# Altium footprint library ICs And Semiconductors SMD.PcbLib: 943 footprints (part 10 of 60)
Each footprint in its own frame and in the unit in brackets; x right, y up, seen from the top. Pads: shape width x height; smd on the part's side, far side on the other; paste and mask are expansions set on the pad; w line width, h text height; cw(c..) or ccw(c..) is an arc to the next point about the centre after c.
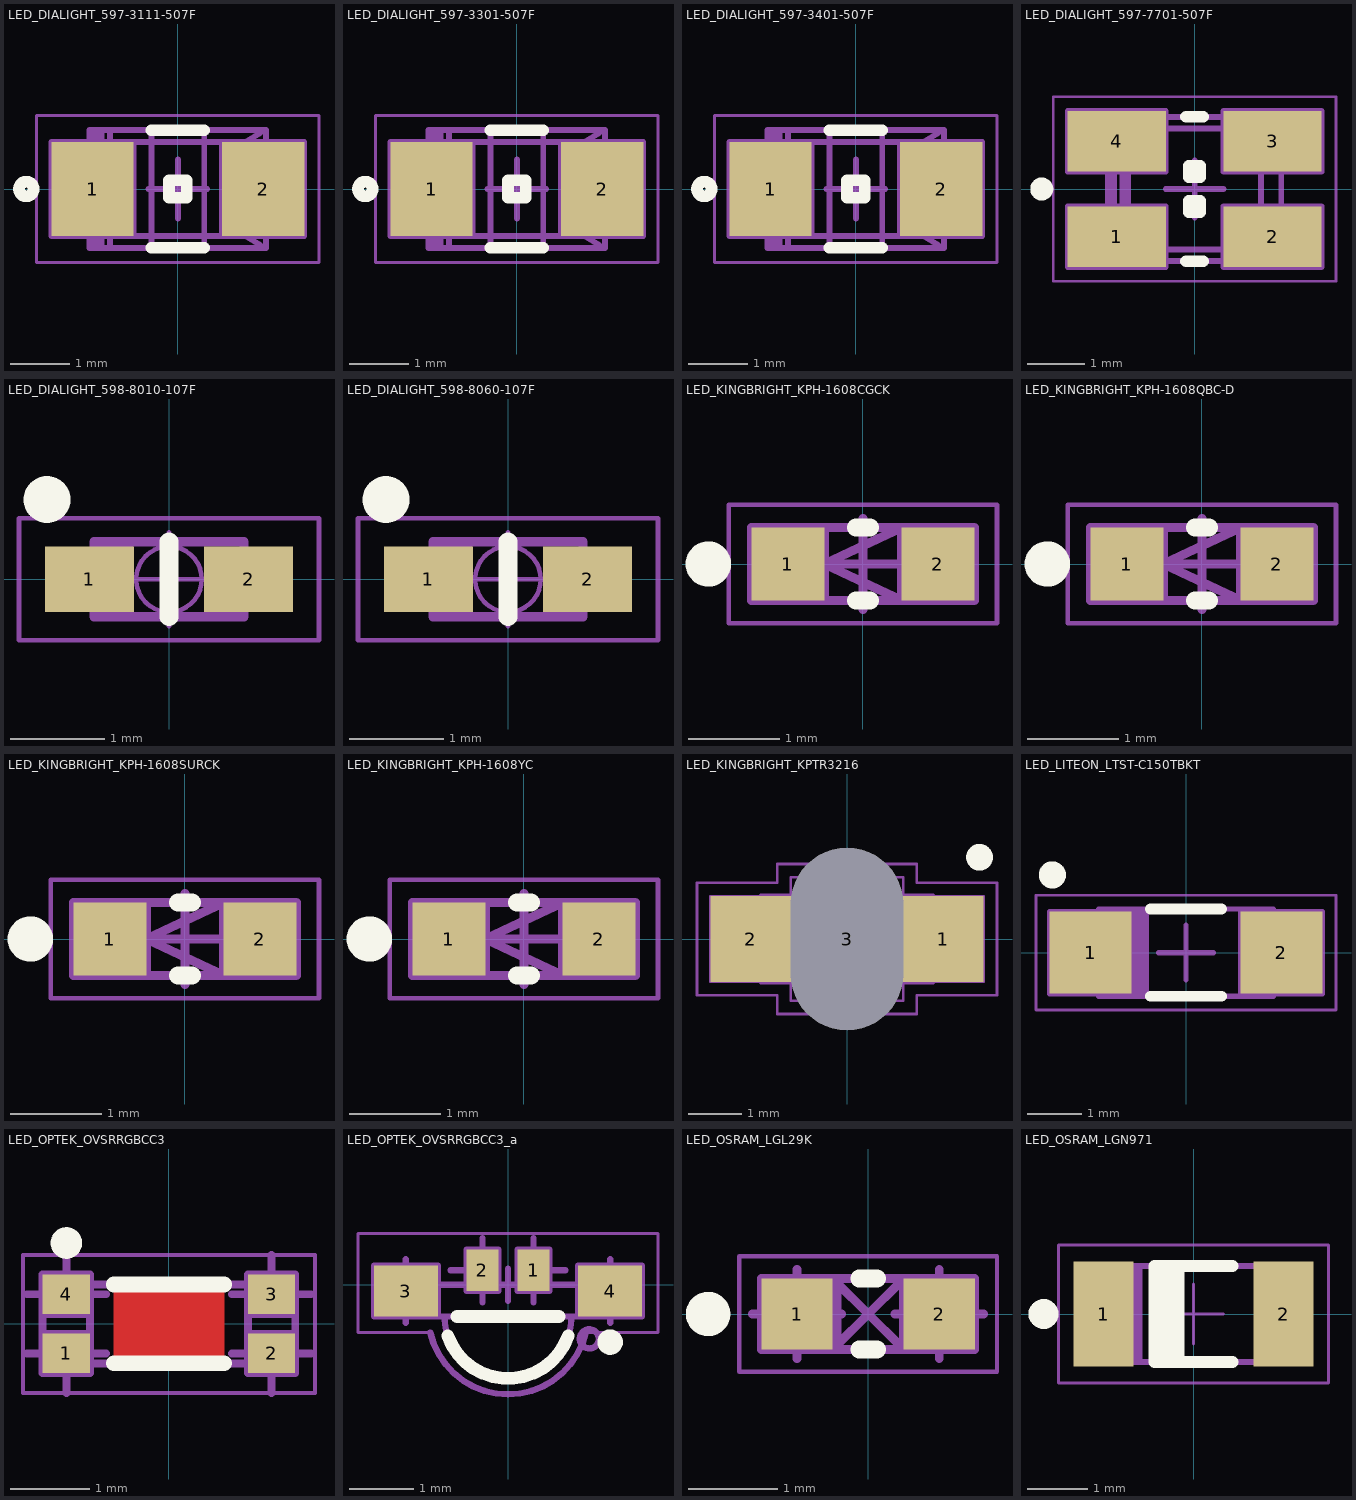
[diagram p9: the footprints below, top view; thin cyan lines are the x and y axes]

## LED_DIALIGHT_597-3111-507F [mm] "SMT AlGaAs Red LED, Body 3x1.6mm (1208),  DIALIGHT 597 Serie"
height 1.5
pads (2):
  rect 1.4x1.6 smd: 1(-1.45,0) 2(1.45,0)
Top Overlay:
  circle w0.2: c-2.575,0 r0.125
  lines w0.2: -0.45,-1 0.45,-1 ; -0.45,1 0.45,1 ; -0.15,-0.15 0.15,-0.15 0.15,0.15 -0.15,0.15 -0.15,-0.15
Mechanical 8:
  lines w0.1: -1.95,0 -1.45,0 ; -1.45,-0.5 -1.45,0 ; -1.45,0.5 -1.45,0 ; -0.95,0 -1.45,0 ; -0.5,0 0,0 ; -0.45,-1 -0.45,1 ; 0,-0.5 0,0 ; 0,0.5 0,0 ; 0.45,-1 0.45,1 ; 0.5,0 0,0 ; 0.95,0 1.45,0 ; 1.45,-0.5 1.45,0 ; 1.45,0.5 1.45,0 ; 1.95,0 1.45,0 ; -2.15,-0.8 -0.75,-0.8 -0.75,0.8 -2.15,0.8 -2.15,-0.8 ; 0.75,-0.8 2.15,-0.8 2.15,0.8 0.75,0.8 0.75,-0.8
Mechanical 14:
  lines w0.1: -1.4,-1 -1.4,1 ; -1.3,-1 -1.3,1 ; -1.15,-0.95 -1.15,0.95 ; -1.15,-0.8 1.15,-0.8 ; -1.15,0.8 1.15,0.8 ; 1.4,-0.95 1.15,-0.8 ; 1.4,0.95 1.15,0.8 ; 1.15,-0.8 1.15,0.8 ; -1.5,-1 1.5,-1 1.5,1 -1.5,1 -1.5,-1 ; -0.15,-0.15 0.15,-0.15 0.15,0.15 -0.15,0.15 -0.15,-0.15
Mechanical 15:
  lines w0.05: -2.4,-1.25 2.4,-1.25 2.4,1.25 -2.4,1.25 -2.4,-1.25
3D body "LED_DIALIGHT_597-3111-507F.stp": height 1.5, standoff 0, extent -1.5,-1 1.5,1

## LED_DIALIGHT_597-3301-507F [mm] "SMT Green LED, Body 3x1.6mm (1208),  DIALIGHT 597 Serie"
height 1.5
pads (2):
  rect 1.4x1.6 smd: 1(-1.45,0) 2(1.45,0)
Top Overlay:
  circle w0.2: c-2.575,0 r0.125
  lines w0.2: -0.45,-1 0.45,-1 ; -0.45,1 0.45,1 ; -0.15,-0.15 -0.15,0.15 0.15,0.15 0.15,-0.15 -0.15,-0.15
Mechanical 8:
  lines w0.1: -1.95,0 -1.45,0 ; -1.45,-0.5 -1.45,0 ; -1.45,0.5 -1.45,0 ; -0.95,0 -1.45,0 ; -0.5,0 0,0 ; -0.45,-1 -0.45,1 ; 0,-0.5 0,0 ; 0,0.5 0,0 ; 0.45,-1 0.45,1 ; 0.5,0 0,0 ; 0.95,0 1.45,0 ; 1.45,-0.5 1.45,0 ; 1.45,0.5 1.45,0 ; 1.95,0 1.45,0 ; -2.15,-0.8 -2.15,0.8 -0.75,0.8 -0.75,-0.8 -2.15,-0.8 ; 0.75,-0.8 0.75,0.8 2.15,0.8 2.15,-0.8 0.75,-0.8
Mechanical 14:
  lines w0.1: -1.4,-1 -1.4,1 ; -1.3,-1 -1.3,1 ; -1.15,-0.95 -1.15,0.95 ; -1.15,-0.8 1.15,-0.8 ; -1.15,0.8 1.15,0.8 ; 1.4,-0.95 1.15,-0.8 ; 1.4,0.95 1.15,0.8 ; 1.15,-0.8 1.15,0.8 ; -1.5,-1 -1.5,1 1.5,1 1.5,-1 -1.5,-1 ; -0.15,-0.15 -0.15,0.15 0.15,0.15 0.15,-0.15 -0.15,-0.15
Mechanical 15:
  lines w0.05: -2.4,-1.25 -2.4,1.25 2.4,1.25 2.4,-1.25 -2.4,-1.25
3D body "LED_DIALIGHT_597-3301-507F.stp": height 1.5, standoff 0, extent -1.5,-1 1.5,1

## LED_DIALIGHT_597-3401-507F [mm] "SMT Yellow LED, Body 3x1.6mm (1208),  DIALIGHT 597 Serie"
height 1.5
pads (2):
  rect 1.4x1.6 smd: 1(-1.45,0) 2(1.45,0)
Top Overlay:
  circle w0.2: c-2.575,0 r0.125
  lines w0.2: -0.45,-1 0.45,-1 ; -0.45,1 0.45,1 ; -0.15,-0.15 -0.15,0.15 0.15,0.15 0.15,-0.15 -0.15,-0.15
Mechanical 8:
  lines w0.1: -1.95,0 -1.45,0 ; -1.45,-0.5 -1.45,0 ; -1.45,0.5 -1.45,0 ; -0.95,0 -1.45,0 ; -0.5,0 0,0 ; -0.45,-1 -0.45,1 ; 0,-0.5 0,0 ; 0,0.5 0,0 ; 0.45,-1 0.45,1 ; 0.5,0 0,0 ; 0.95,0 1.45,0 ; 1.45,-0.5 1.45,0 ; 1.45,0.5 1.45,0 ; 1.95,0 1.45,0 ; -2.15,-0.8 -2.15,0.8 -0.75,0.8 -0.75,-0.8 -2.15,-0.8 ; 0.75,-0.8 0.75,0.8 2.15,0.8 2.15,-0.8 0.75,-0.8
Mechanical 14:
  lines w0.1: -1.4,-1 -1.4,1 ; -1.3,-1 -1.3,1 ; -1.15,-0.95 -1.15,0.95 ; -1.15,-0.8 1.15,-0.8 ; -1.15,0.8 1.15,0.8 ; 1.4,-0.95 1.15,-0.8 ; 1.4,0.95 1.15,0.8 ; 1.15,-0.8 1.15,0.8 ; -1.5,-1 -1.5,1 1.5,1 1.5,-1 -1.5,-1 ; -0.15,-0.15 -0.15,0.15 0.15,0.15 0.15,-0.15 -0.15,-0.15
Mechanical 15:
  lines w0.05: -2.4,-1.25 -2.4,1.25 2.4,1.25 2.4,-1.25 -2.4,-1.25
3D body "LED_DIALIGHT_597-3401-507F.stp": height 1.5, standoff 0, extent -1.5,-1 1.5,1

## LED_DIALIGHT_597-7701-507F [mm] "Bicolor Red/Green SMD LED, Body L 3mm x  W 2.5mm, DIALIGHT 597 Series"
height 1.3
pads (4):
  rect 1.7x1.05 smd: 1(-1.35,-0.825) 2(1.35,-0.825) 3(1.35,0.825) 4(-1.35,0.825)
Top Overlay:
  circle w0.2: c-2.65,0 r0.1
  lines w0.2: -0.15,-1.25 0.15,-1.25 ; -0.15,1.25 0.15,1.25 ; -0.1,-0.4 -0.1,-0.2 0.1,-0.2 0.1,-0.4 -0.1,-0.4 ; -0.1,0.2 0.1,0.2 0.1,0.4 -0.1,0.4 -0.1,0.2
Mechanical 8:
  lines w0.1: -1.85,-0.825 -1.35,-0.825 ; -1.85,0.825 -1.35,0.825 ; -1.35,-1.325 -1.35,-0.825 ; -1.35,-0.325 -1.35,-0.825 ; -1.35,0.325 -1.35,0.825 ; -1.35,1.325 -1.35,0.825 ; -0.85,-0.825 -1.35,-0.825 ; -0.85,0.825 -1.35,0.825 ; -0.5,0 0,0 ; 0,-0.5 0,0 ; 0,0.5 0,0 ; 0.5,0 0,0 ; 0.85,-0.825 1.35,-0.825 ; 0.85,0.825 1.35,0.825 ; 1.35,-1.325 1.35,-0.825 ; 1.35,-0.325 1.35,-0.825 ; 1.35,0.325 1.35,0.825 ; 1.35,1.325 1.35,0.825 ; 1.85,-0.825 1.35,-0.825 ; 1.85,0.825 1.35,0.825 ; -2.2,-1.35 -2.2,-0.3 -0.5,-0.3 -0.5,-1.35 -2.2,-1.35 ; -2.2,0.3 -2.2,1.35 -0.5,1.35 -0.5,0.3 -2.2,0.3 ; 0.5,-1.35 0.5,-0.3 2.2,-0.3 2.2,-1.35 0.5,-1.35 ; 0.5,0.3 0.5,1.35 2.2,1.35 2.2,0.3 0.5,0.3
Mechanical 14:
  lines w0.1: -1.4,-1.25 -1.4,1.25 ; -1.25,-1.25 -1.25,1.25 ; -1.5,-1.25 -1.5,1.25 1.5,1.25 1.5,-1.25 -1.5,-1.25 ; -1.15,-1.05 -1.15,1.05 1.15,1.05 1.15,-1.05 -1.15,-1.05 ; -0.1,-0.4 -0.1,-0.2 0.1,-0.2 0.1,-0.4 -0.1,-0.4 ; -0.1,0.2 0.1,0.2 0.1,0.4 -0.1,0.4 -0.1,0.2
Mechanical 15:
  lines w0.05: -2.45,-1.6 -2.45,1.6 2.45,1.6 2.45,-1.6 -2.45,-1.6
3D body "LED_DIALIGHT_597-7701-507F.stp": height 1.3, standoff 0, extent -1.5,-1.25 1.5,1.25

## LED_DIALIGHT_598-8010-107F [mm] "SMT Red LED, Body 1.6x0.8mm, 0603 Case,  DIALIGHT 598 Series"
height 0.7
pads (2):
  rect 0.95x0.7 smd: 1(-0.85,0) 2(0.85,0)
Top Overlay:
  circle w0.25: c-1.3,0.85 r0.125
  lines w0.2: 0,-0.4 0,0.4
Mechanical 8:
  lines w0.001: -0.8,-0.4 0.8,-0.4 0.8,0.4 -0.8,0.4 -0.8,-0.4
Mechanical 14:
  lines w0.1: -0.8,0 -0.4,0.4 ; -0.8,0.1 -0.5,0.4 ; -0.8,0.2 -0.6,0.4 ; -0.8,0.3 -0.7,0.4 ; -0.8,-0.4 0.8,-0.4 0.8,0.4 -0.8,0.4 -0.8,-0.4
Mechanical 15:
  circle w0.05: c0,0 r0.35
  lines w0.05: -0.5,0 0.5,0 ; 0,-0.5 0,0.5 ; -1.6,-0.65 1.6,-0.65 1.6,0.65 -1.6,0.65 -1.6,-0.65
3D body "LED_DIALIGHT_598-8010-107F_Part1.stp": height 0.51, standoff -0.01, extent -0.813,-0.394 0.813,0.394
3D body "LED_DIALIGHT_598-8010-107F_Part2.stp": height 0.71, standoff 0.31, extent -0.546,-0.381 0.546,0.381

## LED_DIALIGHT_598-8060-107F [mm] "SMT Yellow-Green LED, Body 1.6x0.8mm, 0603 Case,  DIALIGHT 598 Series"
height 0.7
pads (2):
  rect 0.95x0.7 smd: 1(-0.85,0) 2(0.85,0)
Top Overlay:
  circle w0.25: c-1.3,0.85 r0.125
  lines w0.2: 0,-0.4 0,0.4
Mechanical 8:
  lines w0.001: -0.8,-0.4 -0.8,0.4 0.8,0.4 0.8,-0.4 -0.8,-0.4
Mechanical 14:
  lines w0.1: -0.8,0 -0.4,0.4 ; -0.8,0.1 -0.5,0.4 ; -0.8,0.2 -0.6,0.4 ; -0.8,0.3 -0.7,0.4 ; -0.8,-0.4 -0.8,0.4 0.8,0.4 0.8,-0.4 -0.8,-0.4
Mechanical 15:
  circle w0.05: c0,0 r0.35
  lines w0.05: -0.5,0 0.5,0 ; 0,-0.5 0,0.5 ; -1.6,-0.65 -1.6,0.65 1.6,0.65 1.6,-0.65 -1.6,-0.65
3D body "LED_DIALIGHT_598-8060-107F_Part1.stp": height 0.51, standoff -0.01, extent -0.813,-0.394 0.813,0.394
3D body "LED_DIALIGHT_598-8060-107F_Part2.stp": height 0.71, standoff 0.31, extent -0.546,-0.381 0.546,0.381

## LED_KINGBRIGHT_KPH-1608CGCK [mm] "SMT Green LED, Case 0603, Body L 1.6 x W 0.8mm H 0.65mm"
height 0.65
pads (2):
  rect 0.8x0.8 smd: 1(-0.825,0) 2(0.825,0)
Top Overlay:
  circle w0.25: c-1.7,0 r0.125
  lines w0.2: -0.075,-0.4 0.075,-0.4 ; -0.075,0.4 0.075,0.4
Mechanical 8:
  lines w0.1: -0.5,0 0,0 ; -0.425,0 0.425,0 ; 0,-0.5 0,0 ; 0,0.5 0,0 ; 0.5,0 0,0 ; -0.425,-0.4 -0.825,0 -0.425,0.4 ; -0.425,-0.4 -0.425,0.4 ; -0.425,-0.4 -1.225,-0.4 -1.225,0.4 -0.425,0.4 ; 1.225,-0.4 0.825,0 1.225,0.4 ; 1.225,-0.4 1.225,0.4 ; 1.225,-0.4 0.425,-0.4 0.425,0.4 1.225,0.4
Mechanical 14:
  lines w0.1: -0.8,-0.4 0.8,-0.4 0.8,0.4 -0.8,0.4 -0.8,-0.4 ; -0.425,0 0.425,-0.4 0.425,0.4 -0.425,0
Mechanical 15:
  lines w0.05: -1.475,-0.65 1.475,-0.65 1.475,0.65 -1.475,0.65 -1.475,-0.65
3D body "LED_KINGBRIGHT_KPH-1608CGCK_Part2.stp": height 0.65, standoff 0.12, extent -0.6,-0.4 0.6,0.4
3D body "LED_KINGBRIGHT_KPH-1608CGCK_Part1.stp": height 0.2, standoff 0, extent -0.8,-0.4 0.8,0.4

## LED_KINGBRIGHT_KPH-1608QBC-D [mm] "SMT Blue LED, Case 0603, Body L 1.6 x W 0.8mm H 0.65mm"
height 0.65
pads (2):
  rect 0.8x0.8 smd: 1(-0.825,0) 2(0.825,0)
Top Overlay:
  circle w0.25: c-1.7,0 r0.125
  lines w0.2: -0.075,-0.4 0.075,-0.4 ; -0.075,0.4 0.075,0.4
Mechanical 8:
  lines w0.1: -0.5,0 0,0 ; -0.425,0 0.425,0 ; 0,-0.5 0,0 ; 0,0.5 0,0 ; 0.5,0 0,0 ; -0.425,-0.4 -1.225,-0.4 -1.225,0.4 -0.425,0.4 ; -0.425,-0.4 -0.425,0.4 ; -0.425,-0.4 -0.825,0 -0.425,0.4 ; 1.225,-0.4 0.425,-0.4 0.425,0.4 1.225,0.4 ; 1.225,-0.4 1.225,0.4 ; 1.225,-0.4 0.825,0 1.225,0.4
Mechanical 14:
  lines w0.1: -0.8,-0.4 -0.8,0.4 0.8,0.4 0.8,-0.4 -0.8,-0.4 ; -0.425,0 0.425,0.4 0.425,-0.4 -0.425,0
Mechanical 15:
  lines w0.05: -1.475,-0.65 -1.475,0.65 1.475,0.65 1.475,-0.65 -1.475,-0.65
3D body "LED_KINGBRIGHT_KPH-1608QBC-D_Part2.stp": height 0.65, standoff 0.12, extent -0.6,-0.4 0.6,0.4
3D body "LED_KINGBRIGHT_KPH-1608QBC-D_Part1.stp": height 0.2, standoff 0, extent -0.8,-0.4 0.8,0.4

## LED_KINGBRIGHT_KPH-1608SURCK [mm] "SMT Hyper Red LED, Case 0603, Body L 1.6 x W 0.8mm H 0.65mm"
height 0.65
pads (2):
  rect 0.8x0.8 smd: 1(-0.825,0) 2(0.825,0)
Top Overlay:
  circle w0.25: c-1.7,0 r0.125
  lines w0.2: -0.075,-0.4 0.075,-0.4 ; -0.075,0.4 0.075,0.4
Mechanical 8:
  lines w0.1: -0.5,0 0,0 ; -0.425,0 0.425,0 ; 0,-0.5 0,0 ; 0,0.5 0,0 ; 0.5,0 0,0 ; -0.425,-0.4 -0.825,0 -0.425,0.4 ; -0.425,-0.4 -0.425,0.4 ; -0.425,-0.4 -1.225,-0.4 -1.225,0.4 -0.425,0.4 ; 1.225,-0.4 0.825,0 1.225,0.4 ; 1.225,-0.4 1.225,0.4 ; 1.225,-0.4 0.425,-0.4 0.425,0.4 1.225,0.4
Mechanical 14:
  lines w0.1: -0.8,-0.4 0.8,-0.4 0.8,0.4 -0.8,0.4 -0.8,-0.4 ; -0.425,0 0.425,-0.4 0.425,0.4 -0.425,0
Mechanical 15:
  lines w0.05: -1.475,-0.65 1.475,-0.65 1.475,0.65 -1.475,0.65 -1.475,-0.65
3D body "LED_KINGBRIGHT_KPH-1608SURCK_Part1.stp": height 0.2, standoff 0, extent -0.8,-0.4 0.8,0.4
3D body "LED_KINGBRIGHT_KPH-1608SURCK_Part2.stp": height 0.65, standoff 0.12, extent -0.6,-0.4 0.6,0.4

## LED_KINGBRIGHT_KPH-1608YC [mm] "SMT Hyper Yellow LED, Case 0603, Body L 1.6 x W 0.8mm H 0.65mm"
height 0.65
pads (2):
  rect 0.8x0.8 smd: 1(-0.825,0) 2(0.825,0)
Top Overlay:
  circle w0.25: c-1.7,0 r0.125
  lines w0.2: -0.075,-0.4 0.075,-0.4 ; -0.075,0.4 0.075,0.4
Mechanical 8:
  lines w0.1: -0.5,0 0,0 ; -0.425,0 0.425,0 ; 0,-0.5 0,0 ; 0,0.5 0,0 ; 0.5,0 0,0 ; -0.425,-0.4 -1.225,-0.4 -1.225,0.4 -0.425,0.4 ; -0.425,-0.4 -0.425,0.4 ; -0.425,-0.4 -0.825,0 -0.425,0.4 ; 1.225,-0.4 0.425,-0.4 0.425,0.4 1.225,0.4 ; 1.225,-0.4 1.225,0.4 ; 1.225,-0.4 0.825,0 1.225,0.4
Mechanical 14:
  lines w0.1: -0.8,-0.4 -0.8,0.4 0.8,0.4 0.8,-0.4 -0.8,-0.4 ; -0.425,0 0.425,0.4 0.425,-0.4 -0.425,0
Mechanical 15:
  lines w0.05: -1.475,-0.65 -1.475,0.65 1.475,0.65 1.475,-0.65 -1.475,-0.65
3D body "LED_KINGBRIGHT_KPH-1608YC_Part2.stp": height 0.65, standoff 0.12, extent -0.6,-0.4 0.6,0.4
3D body "LED_KINGBRIGHT_KPH-1608YC_Part1.stp": height 0.2, standoff 0, extent -0.8,-0.4 0.8,0.4

## LED_KINGBRIGHT_KPTR3216 [mm] "Reverse Mount LED 3216, Hole 2.1x2.3mm 0.35mm Height"
height 0.35
pads (3):
  rect 1.5x1.6 smd: 1(1.8,0) 2(-1.8,0)
  oval 1.9x3.2 hole 2.1 slot 3.4 at 90 deg unplated mask+0.1: 3(0,0)
Top Overlay:
  circle w0.25: c2.475,1.525 r0.125
Mechanical 8:
  lines w0.05: -2.3,0 -1.8,0 ; -1.8,-0.5 -1.8,0 ; -1.8,0.5 -1.8,0 ; -1.3,0 -1.8,0 ; -1.05,-0.8 -2.55,-0.8 -2.55,0.8 -1.05,0.8 ; -0.5,0 0,0 ; 0,-0.5 0,0 ; 0,0.5 0,0 ; 0.5,0 0,0 ; 1.05,-0.8 2.55,-0.8 2.55,0.8 1.05,0.8 ; 1.3,0 1.8,0 ; 1.8,-0.5 1.8,0 ; 1.8,0.5 1.8,0 ; 2.3,0 1.8,0 ; -1.05,-1.15 1.05,-1.15 1.05,1.15 -1.05,1.15 -1.05,-1.15
Mechanical 14:
  lines w0.1: -1,-0.8 -1,0.8 ; -0.8,-0.8 -0.8,-0.4 0.8,-0.4 0.8,0.4 -0.8,0.4 -0.8,0.8 ; 1,-0.8 1,0.8 ; -1.6,-0.8 1.6,-0.8 1.6,0.8 -1.6,0.8 -1.6,-0.8
Mechanical 15:
  lines w0.05: -2.8,-1.05 -1.3,-1.05 -1.3,-1.4 1.3,-1.4 1.3,-1.05 2.8,-1.05 2.8,1.05 1.3,1.05 1.3,1.4 -1.3,1.4 -1.3,1.05 -2.8,1.05 -2.8,-1.05
3D body "LED_KINGBRIGHT_KPTR3216_part1.stp": height 0.25, standoff -0.15, extent -1.6,-0.8 1.6,0.8
3D body "LED_KINGBRIGHT_KPTR3216_part2.stp": height 0, standoff -0.8, extent -0.7,-0.8 0.7,0.8

## LED_LITEON_LTST-C150TBKT [mm] "SMD InGaN Blue LED, 2-Leads, Body 3.2x1.6mm"
height 1.1
pads (2):
  rect 1.5x1.5 smd: 1(-1.75,0) 2(1.75,0)
Top Overlay:
  circle w0.25: c-2.45,1.425 r0.125
  lines w0.2: -0.65,-0.8 0.65,-0.8 ; -0.65,0.8 0.65,0.8
Mechanical 8:
  lines w0.1: -2.25,0 -1.75,0 ; -1.75,-0.5 -1.75,0 ; -1.75,0.5 -1.75,0 ; -1.25,0 -1.75,0 ; -0.5,0 0,0 ; 0,-0.5 0,0 ; 0,0.5 0,0 ; 0.5,0 0,0 ; 1.25,0 1.75,0 ; 1.75,-0.5 1.75,0 ; 1.75,0.5 1.75,0 ; 2.25,0 1.75,0 ; -2.5,-0.75 -2.5,0.75 -1,0.75 -1,-0.75 -2.5,-0.75 ; 1,-0.75 1,0.75 2.5,0.75 2.5,-0.75 1,-0.75
Mechanical 14:
  lines w0.1: -1.1,-0.8 -1.1,0.8 ; -1.03,-0.8 -1.03,0.8 ; -0.93,-0.8 -0.93,0.8 ; -0.83,-0.8 -0.83,0.8 ; -0.73,-0.8 -0.73,0.8 ; 1.03,-0.8 1.03,0.8 ; -1.6,-0.8 1.6,-0.8 1.6,-0.245 cw(c1.65,0) 1.6,0.245 1.6,0.8 -1.6,0.8 -1.6,0.245 cw(c-1.65,0) -1.6,-0.245 -1.6,-0.8
Mechanical 15:
  lines w0.05: -2.75,-1.05 -2.75,1.05 2.75,1.05 2.75,-1.05 -2.75,-1.05
3D body "LED_LITEON_LTST-C150TBKT.stp": height 1.1, standoff 0, extent -1.6,-0.8 1.6,0.8

## LED_OPTEK_OVSRRGBCC3 [mm] "Top Mount, Full-Color (RGB), 1204 Surface Mount LED (150° Viewing Angle)"
height 1.5
pads (4):
  rect 0.6x0.5 smd: 1(-1.3,-0.375) 2(1.3,-0.375) 3(1.3,0.375) 4(-1.3,0.375)
Top Layer:
  pour cut-out: -0.7,0.5 -0.7,-0.5 0.7,-0.5 0.7,0.5
Top Overlay:
  circle w0.2: c-1.3,1.025 r0.1
  lines w0.2: -0.7,-0.5 0.7,-0.5 ; -0.7,0.5 0.7,0.5
Mechanical 8:
  lines w0.1: -1.8,-0.375 -1.3,-0.375 ; -1.8,0.375 -1.3,0.375 ; -1.3,-0.875 -1.3,-0.375 ; -1.3,0.875 -1.3,0.375 ; -0.8,-0.375 -1.3,-0.375 ; -0.8,0.375 -1.3,0.375 ; -0.5,0 0,0 ; 0,-0.5 0,0 ; 0,0.5 0,0 ; 0.5,0 0,0 ; 0.8,-0.375 1.3,-0.375 ; 0.8,0.375 1.3,0.375 ; 1.3,-0.875 1.3,-0.375 ; 1.3,0.875 1.3,0.375 ; 1.8,-0.375 1.3,-0.375 ; 1.8,0.375 1.3,0.375 ; -1.6,-0.625 -1.6,-0.125 -1,-0.125 -1,-0.625 -1.6,-0.625 ; -1.6,0.125 -1.6,0.625 -1,0.625 -1,0.125 -1.6,0.125 ; 1,-0.625 1,-0.125 1.6,-0.125 1.6,-0.625 1,-0.625 ; 1,0.125 1,0.625 1.6,0.625 1.6,0.125 1,0.125
Mechanical 14:
  lines w0.1: -1.375,0.3 -1.025,0.3 ; -1.3,0.4 -1,0.4 ; -1,-0.5 -1,0.5 ; -1,0.2 -1.6,0.2 ; 1,-0.5 1,0.5 ; 1.299,0.5 ccw(c1.6,0.5) 1.6,0.199 ; 1.3,0.5 -1.3,0.5 cw(c-1.6,0.5) -1.6,0.2 ; 1.6,0.2 1.6,-0.2 ccw(c1.6,-0.5) 1.3,-0.5 -1.3,-0.5 ccw(c-1.6,-0.5) -1.6,-0.2 -1.6,0.2
Mechanical 15:
  lines w0.05: -1.85,-0.875 -1.85,0.875 1.85,0.875 1.85,-0.875 -1.85,-0.875
3D body "LED_OPTEK_OVSRRGBCC3.stp": height 1.47, standoff 0, extent -1.6,-0.5 1.6,0.5

## LED_OPTEK_OVSRRGBCC3_a [mm] "Side Mount, Full-Color (RGB), 1204 Surface Mount LED (150° Viewing Angle)"
height 1
pads (4):
  rect 0.5x0.65 smd: 1(0.4,0.225) 2(-0.4,0.225)
  rect 1x0.8 smd: 3(-1.6,-0.1) 4(1.6,-0.1)
Top Overlay:
  circle w0.2: c1.6,-0.9 r0.1
  lines w0.2: -0.944,-0.8 ccw(c0,-0.47) 0.944,-0.8 ; -0.8,-0.5 0.8,-0.5
Mechanical 8:
  lines w0.1: -2.1,-0.1 -1.6,-0.1 ; -1.6,-0.6 -1.6,-0.1 ; -1.6,0.4 -1.6,-0.1 ; -1.1,-0.1 -1.6,-0.1 ; -0.9,0.225 -0.4,0.225 ; -0.4,-0.275 -0.4,0.225 ; -0.4,0.725 -0.4,0.225 ; -0.25,0 0,0 ; 0,-0.25 0,0 ; 0,0.25 0,0 ; 0.25,0 0,0 ; 0.4,-0.275 0.4,0.225 ; 0.4,0.725 0.4,0.225 ; 0.9,0.225 0.4,0.225 ; 1.1,-0.1 1.6,-0.1 ; 1.6,-0.6 1.6,-0.1 ; 1.6,0.4 1.6,-0.1 ; 2.1,-0.1 1.6,-0.1 ; -2.1,-0.5 -2.1,0.3 -1.1,0.3 -1.1,-0.5 -2.1,-0.5 ; -0.65,-0.1 -0.65,0.55 -0.15,0.55 -0.15,-0.1 -0.65,-0.1 ; 0.15,-0.1 0.15,0.55 0.65,0.55 0.65,-0.1 0.15,-0.1 ; 1.1,-0.5 1.1,0.3 2.1,0.3 2.1,-0.5 1.1,-0.5
Mechanical 14:
  circle w0.1: c1.275,-0.85 r0.15
  lines w0.1: -1,-0.5 ccw(c0,-0.47) 1,-0.5 ; -1.6,-0.5 1.6,-0.5 1.6,0 -1.6,0 -1.6,-0.5
Mechanical 15:
  lines w0.05: -1.218,-0.75 -2.35,-0.75 -2.35,0.8 2.35,0.8 2.35,-0.75 1.218,-0.75
  lines w0.1: -1.218,-0.75 ccw(c0,-0.47) 1.218,-0.75
3D body "LED_OPTEK_OVSRRGBCC3_a.stp": height 1, standoff 0, extent -1.6,-1.37 1.6,0.105

## LED_OSRAM_LGL29K [mm] "Green Chip LED, 2-Leads, Body 1.7x0.8mm, IPC Medium Density"
height 0.67
pads (2):
  rect 0.8x0.8 smd: 1(-0.8,0) 2(0.8,0)
Top Overlay:
  circle w0.25: c-1.8,0 r0.125
  lines w0.2: -0.1,-0.4 0.1,-0.4 ; -0.1,0.4 0.1,0.4
Mechanical 8:
  lines w0.1: -1.3,0 -0.8,0 ; -0.8,-0.5 -0.8,0 ; -0.8,0.5 -0.8,0 ; -0.354,-0.354 0,0 ; -0.354,0.354 0,0 ; -0.3,0 -0.8,0 ; 0.3,0 0.8,0 ; 0.354,-0.354 0,0 ; 0.354,0.354 0,0 ; 0.8,-0.5 0.8,0 ; 0.8,0.5 0.8,0 ; 1.3,0 0.8,0 ; -1.2,-0.4 -0.4,-0.4 -0.4,0.4 -1.2,0.4 -1.2,-0.4 ; 0.4,-0.4 1.2,-0.4 1.2,0.4 0.4,0.4 0.4,-0.4
Mechanical 14:
  lines w0.1: -0.65,-0.35 -0.85,-0.35 -0.85,0.35 -0.65,0.35 ; -0.55,-0.4 -0.55,0.4 ; -0.45,-0.4 -0.45,0.4 ; -0.35,-0.4 -0.35,0.4 ; 0.65,-0.35 0.85,-0.35 0.85,0.35 0.65,0.35 ; -0.65,-0.4 -0.65,0.4 0.65,0.4 0.65,-0.4 -0.65,-0.4
Mechanical 15:
  lines w0.05: -1.45,-0.65 -1.45,0.65 1.45,0.65 1.45,-0.65 -1.45,-0.65
3D body "LED_OSRAM_LGL29K.stp": height 0.67, standoff 0, extent -0.85,-0.4 0.85,0.4

## LED_OSRAM_LGN971 [mm] "Green Chip LED, 2-Leads, Body 3.2 x1.6mm, IPC Medium Density"
height 1.2
pads (2):
  rect 1x1.75 smd: 1(-1.5,0) 2(1.5,0)
Top Overlay:
  circle w0.25: c-2.5,0 r0.125
  lines w0.2: -0.45,-0.8 -0.45,0.8 ; -0.25,-0.8 -0.25,0.8 ; 0.65,-0.8 -0.65,-0.8 -0.65,0.8 0.65,0.8
Mechanical 14:
  lines w0.1: -1.5,-0.8 -1.5,0.8 ; -1.4,-0.8 -1.4,0.8 ; -1.3,-0.8 -1.3,0.8 ; -1.2,-0.8 -1.2,0.8 ; -1.1,-0.8 -1.1,0.8 ; -1,-0.8 -1,0.8 ; -0.9,-0.8 -0.9,0.8 ; -1.6,-0.8 1.6,-0.8 1.6,0.8 -1.6,0.8 -1.6,-0.8
Mechanical 15:
  lines w0.05: -0.5,0 0.5,0 ; 0,-0.5 0,0.5 ; -2.25,-1.15 2.25,-1.15 2.25,1.15 -2.25,1.15 -2.25,-1.15
3D body "LED_OSRAM_LGN971.stp": height 1.2, standoff 0, extent -1.65,-0.85 1.65,0.85